# Altium footprint library Mechanical_Old.PcbLib: 125 footprints (part 4 of 8)
Each footprint in its own frame and in the unit in brackets; x right, y up, seen from the top. Pads: shape width x height; smd on the part's side, far side on the other; paste and mask are expansions set on the pad; w line width, h text height; cw(c..) or ccw(c..) is an arc to the next point about the centre after c.
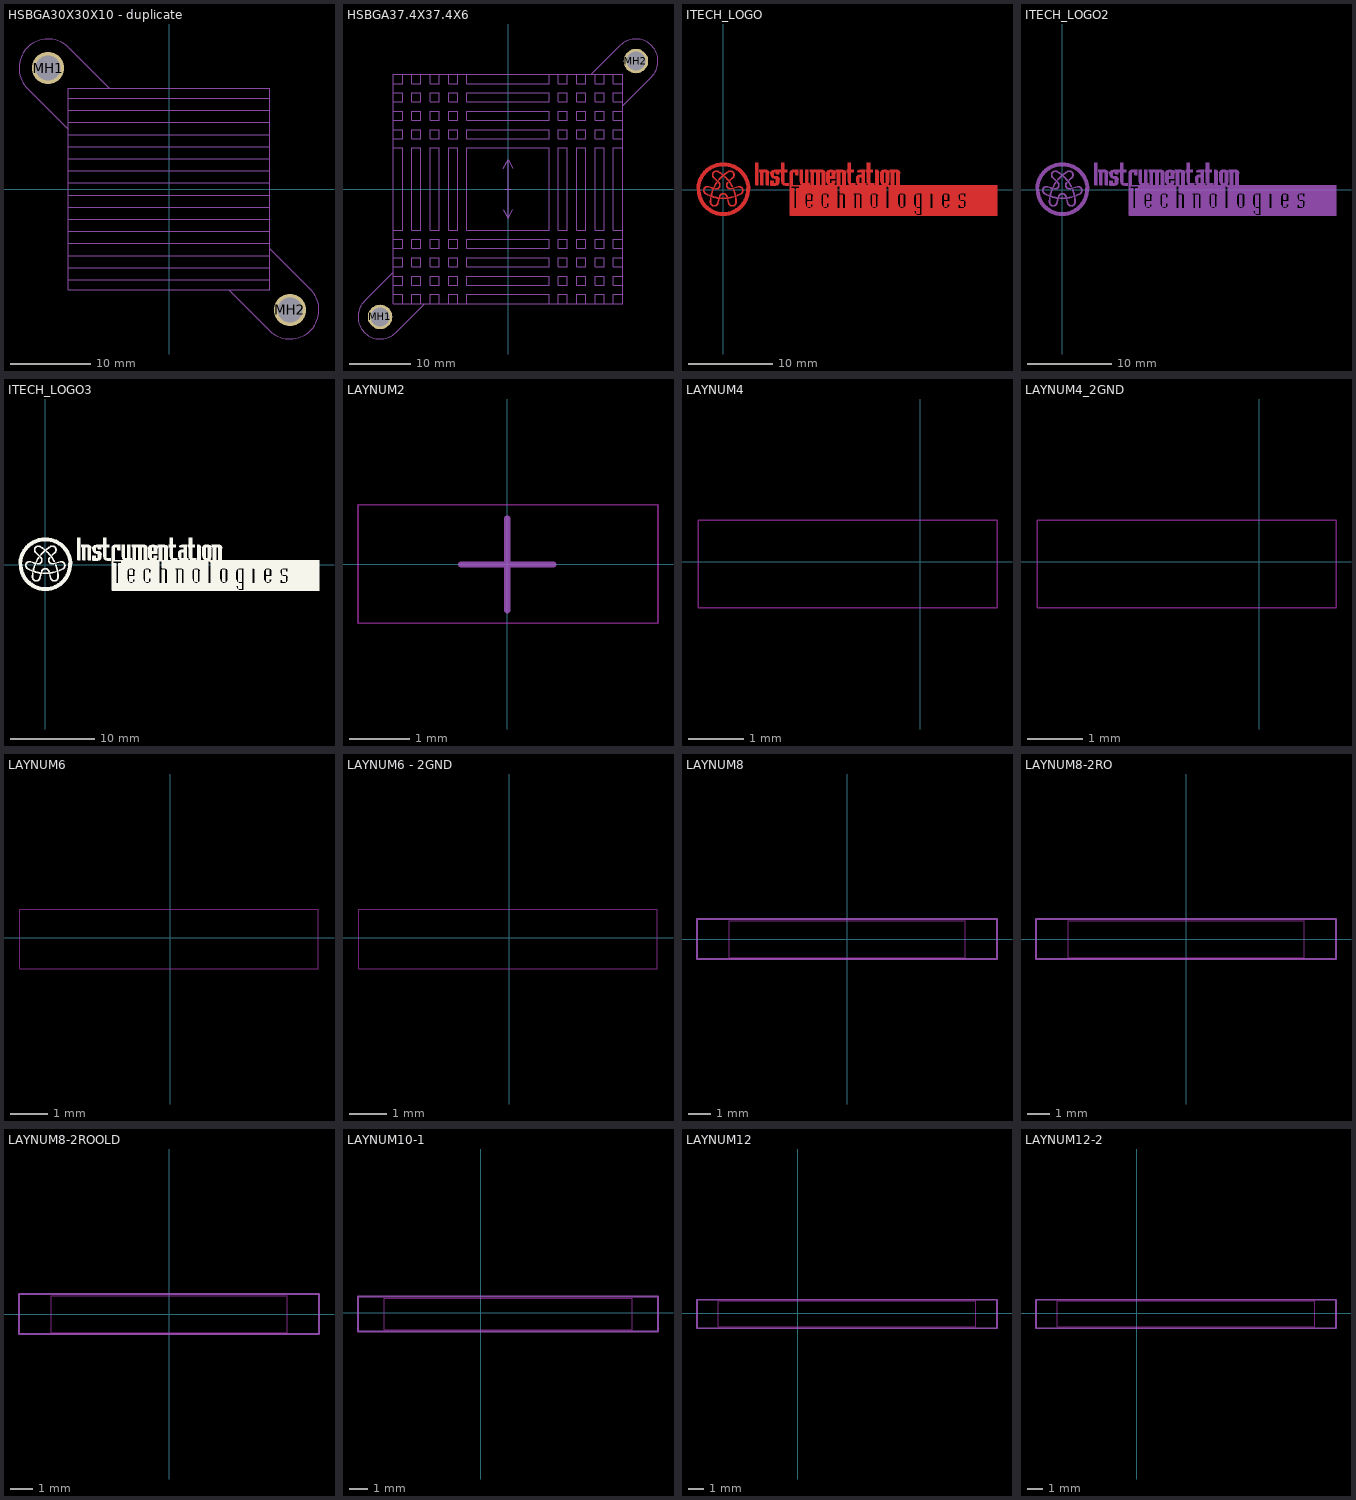
[diagram p3: the footprints below, top view; thin cyan lines are the x and y axes]

## HSBGA30X30X10 - duplicate [mm] "Heatsink BGA 30x30x10mm with push pins"
height 10
pads (2):
  round 4 hole 3.1 mask+0.254: MH1(-15,15) MH2(15,-15)
Mechanical 13:
  circle w0.104: c15,-15 r1.5
  circle w0.104: c-15,15 r1.5
  lines w0.102: -17.546,12.454 -12.496,7.404 ; -12.5,-11.25 12.5,-11.25 ; -12.5,-9.75 12.5,-9.75 ; -12.5,-8.25 12.5,-8.25 ; -12.5,-6.75 12.5,-6.75 ; -12.5,-5.25 12.5,-5.25 ; -12.5,-3.75 12.5,-3.75 ; -12.5,-2.25 12.5,-2.25 ; -12.5,-0.75 12.5,-0.75 ; -12.5,0.75 12.5,0.75 ; -12.5,2.25 12.5,2.25 ; -12.5,3.75 12.5,3.75 ; -12.5,5.25 12.5,5.25 ; -12.5,6.75 12.5,6.75 ; -12.5,8.25 12.5,8.25 ; -12.5,9.75 12.5,9.75 ; -12.5,11.25 12.5,11.25 ; -12.454,17.546 -7.454,12.546 ; 7.454,-12.546 12.454,-17.546 ; 12.496,-7.404 17.546,-12.454 ; -12.5,-12.5 12.5,-12.5 12.5,12.5 -12.5,12.5 -12.5,-12.5
  lines w0.104: -17.546,12.454 cw(c-15,15) -12.454,17.546 ; 12.454,-17.546 ccw(c15,-15) 17.546,-12.454
3D body: height 12.2, standoff 2.2, extent -12.5,-12.5 -1.6,-11.25
3D body: height 12.2, standoff 2.2, extent 1.6,-12.5 12.5,-11.25
3D body: height 12.2, standoff 2.2, extent -12.5,-9.5 -1.6,-8.25
3D body: height 12.2, standoff 2.2, extent 1.6,-9.5 12.5,-8.25
3D body: height 12.2, standoff 2.2, extent -12.5,-6.5 -1.6,-5.25
3D body: height 12.2, standoff 2.2, extent 1.6,-6.5 12.5,-5.25
3D body: height 12.2, standoff 2.2, extent -12.5,-3.5 -1.6,-2.25
3D body: height 12.2, standoff 2.2, extent 1.6,-3.5 12.5,-2.25
3D body: height 12.2, standoff 2.2, extent -12.5,-0.5 -1.6,0.75
3D body: height 12.2, standoff 2.2, extent 1.6,-0.5 12.5,0.75
3D body: height 12.2, standoff 2.2, extent -12.5,2.5 -1.6,3.75
3D body: height 12.2, standoff 2.2, extent 1.6,2.5 12.5,3.75
3D body: height 12.2, standoff 2.2, extent -12.5,5.5 -1.6,6.75
3D body: height 12.2, standoff 2.2, extent 1.6,5.5 12.5,6.75
3D body: height 12.2, standoff 2.2, extent -12.5,8.5 -1.6,9.75
3D body: height 12.2, standoff 2.2, extent 1.6,8.5 12.5,9.75
3D body: height 12.2, standoff 2.2, extent 1.6,11.25 12.5,12.5
3D body: height 12.2, standoff 2.2, extent -12.5,11.25 -1.6,12.5
3D body: height 3.2, standoff 2.2, extent 11.4,-18.593 18.571,-11.407
3D body: height 3.2, standoff 2.2, extent 7.4,-17.546 17.546,-7.404
3D body: height 3.2, standoff 2.2, extent -17.546,7.404 -7.4,17.546
3D body: height 3.2, standoff 2.2, extent -18.571,11.407 -11.4,18.593
3D body: height 3.2, standoff 2.2, extent -12.5,-12.5 12.5,12.5

## HSBGA37.4X37.4X6 [mm] "Heatsink BGA 37.4x37.4x6mm with push pins"
height 6
pads (2):
  round 4 hole 3.1 mask+0.254: MH1(-20.87,-20.87) MH2(20.87,20.87)
Mechanical 13:
  drawing of 337 lines, arcs and shapes, not listed
Mechanical 15:
  lines w0.102: -0.5,0 0.5,0 ; 0,-0.5 0,0.5
  text "Dvigni po potrebi!" at -12.7,19.6 h1.52
3D body: height 10.55, standoff 4.55, extent -18.7,-6.7 -17.2,6.7
3D body: height 10.55, standoff 4.55, extent -15.7,-6.7 -14.2,6.7
3D body: height 10.55, standoff 4.55, extent -12.7,-6.7 -11.2,6.7
3D body: height 10.55, standoff 4.55, extent -9.7,-6.7 -8.2,6.7
3D body: height 10.55, standoff 4.55, extent 8.2,-6.7 9.7,6.7
3D body: height 10.55, standoff 4.55, extent 11.2,-6.7 12.7,6.7
3D body: height 10.55, standoff 4.55, extent 14.2,-6.7 15.7,6.7
3D body: height 10.55, standoff 4.55, extent 17.2,-6.7 18.7,6.7
3D body: height 10.55, standoff 4.55, extent -6.7,17.2 6.7,18.7
3D body: height 10.55, standoff 4.55, extent -6.7,14.2 6.7,15.7
3D body: height 10.55, standoff 4.55, extent -6.7,11.2 6.7,12.7
3D body: height 10.55, standoff 4.55, extent -6.7,8.2 6.7,9.7
3D body: height 10.55, standoff 4.55, extent -6.7,-18.7 6.7,-17.2
3D body: height 10.55, standoff 4.55, extent -6.7,-15.7 6.7,-14.2
3D body: height 10.55, standoff 4.55, extent -6.7,-12.7 6.7,-11.2
3D body: height 10.55, standoff 4.55, extent -6.7,-9.7 6.7,-8.2
3D body: height 10.55, standoff 4.55, extent -6.7,-6.7 6.7,6.7
3D body: height 10.55, standoff 4.55, extent -18.7,17.2 -17.2,18.7
3D body: height 10.55, standoff 4.55, extent -15.7,17.2 -14.2,18.7
3D body: height 10.55, standoff 4.55, extent -15.7,14.2 -14.2,15.7
3D body: height 10.55, standoff 4.55, extent -18.7,14.2 -17.2,15.7
3D body: height 10.55, standoff 4.55, extent -12.7,17.2 -11.2,18.7
3D body: height 10.55, standoff 4.55, extent -12.7,14.2 -11.2,15.7
3D body: height 10.55, standoff 4.55, extent -9.7,17.2 -8.2,18.7
3D body: height 10.55, standoff 4.55, extent -9.7,14.2 -8.2,15.7
3D body: height 10.55, standoff 4.55, extent -9.7,11.2 -8.2,12.7
3D body: height 10.55, standoff 4.55, extent -12.7,11.2 -11.2,12.7
3D body: height 10.55, standoff 4.55, extent -15.7,11.2 -14.2,12.7
3D body: height 10.55, standoff 4.55, extent -18.7,11.2 -17.2,12.7
3D body: height 10.55, standoff 4.55, extent -18.7,8.2 -17.2,9.7
3D body: height 10.55, standoff 4.55, extent -15.7,8.2 -14.2,9.7
3D body: height 10.55, standoff 4.55, extent -12.7,8.2 -11.2,9.7
3D body: height 10.55, standoff 4.55, extent -9.7,8.2 -8.2,9.7
3D body: height 10.55, standoff 4.55, extent 8.2,17.2 9.7,18.7
3D body: height 10.55, standoff 4.55, extent 11.2,17.2 12.7,18.7
3D body: height 10.55, standoff 4.55, extent 14.2,17.2 15.7,18.7
3D body: height 10.55, standoff 4.55, extent 17.2,17.2 18.7,18.7
3D body: height 10.55, standoff 4.55, extent 17.2,14.2 18.7,15.7
3D body: height 10.55, standoff 4.55, extent 17.2,11.2 18.7,12.7
3D body: height 10.55, standoff 4.55, extent 17.2,8.2 18.7,9.7
3D body: height 10.55, standoff 4.55, extent 14.2,8.2 15.7,9.7
3D body: height 10.55, standoff 4.55, extent 14.2,11.2 15.7,12.7
3D body: height 10.55, standoff 4.55, extent 14.2,14.2 15.7,15.7
3D body: height 10.55, standoff 4.55, extent 11.2,14.2 12.7,15.7
3D body: height 10.55, standoff 4.55, extent 11.2,11.2 12.7,12.7
3D body: height 10.55, standoff 4.55, extent 11.2,8.2 12.7,9.7
3D body: height 10.55, standoff 4.55, extent 8.2,8.2 9.7,9.7
3D body: height 10.55, standoff 4.55, extent 8.2,11.2 9.7,12.7
3D body: height 10.55, standoff 4.55, extent 8.2,14.2 9.7,15.7
3D body: height 10.55, standoff 4.55, extent 8.2,-9.7 9.7,-8.2
3D body: height 10.55, standoff 4.55, extent 11.2,-9.7 12.7,-8.2
3D body: height 10.55, standoff 4.55, extent 14.2,-9.7 15.7,-8.2
3D body: height 10.55, standoff 4.55, extent 17.2,-9.7 18.7,-8.2
3D body: height 10.55, standoff 4.55, extent 17.2,-12.7 18.7,-11.2
3D body: height 10.55, standoff 4.55, extent 17.2,-15.7 18.7,-14.2
3D body: height 10.55, standoff 4.55, extent 17.2,-18.7 18.7,-17.2
3D body: height 10.55, standoff 4.55, extent 14.2,-18.7 15.7,-17.2
3D body: height 10.55, standoff 4.55, extent 11.2,-18.7 12.7,-17.2
3D body: height 10.55, standoff 4.55, extent 8.2,-18.7 9.7,-17.2
3D body: height 10.55, standoff 4.55, extent 8.2,-15.7 9.7,-14.2
3D body: height 10.55, standoff 4.55, extent 11.2,-15.7 12.7,-14.2
3D body: height 10.55, standoff 4.55, extent 14.2,-15.7 15.7,-14.2
3D body: height 10.55, standoff 4.55, extent 14.2,-12.7 15.7,-11.2
3D body: height 10.55, standoff 4.55, extent 11.2,-12.7 12.7,-11.2
3D body: height 10.55, standoff 4.55, extent 8.2,-12.7 9.7,-11.2
3D body: height 10.55, standoff 4.55, extent -18.7,-9.7 -17.2,-8.2
3D body: height 10.55, standoff 4.55, extent -15.7,-9.7 -14.2,-8.2
3D body: height 10.55, standoff 4.55, extent -12.7,-9.7 -11.2,-8.2
3D body: height 10.55, standoff 4.55, extent -9.7,-9.7 -8.2,-8.2
3D body: height 10.55, standoff 4.55, extent -9.7,-12.7 -8.2,-11.2
3D body: height 10.55, standoff 4.55, extent -12.7,-12.7 -11.2,-11.2
3D body: height 10.55, standoff 4.55, extent -15.7,-12.7 -14.2,-11.2
3D body: height 10.55, standoff 4.55, extent -18.7,-12.7 -17.2,-11.2
3D body: height 10.55, standoff 4.55, extent -18.7,-15.7 -17.2,-14.2
3D body: height 10.55, standoff 4.55, extent -15.7,-15.7 -14.2,-14.2
3D body: height 10.55, standoff 4.55, extent -12.7,-15.7 -11.2,-14.2
3D body: height 10.55, standoff 4.55, extent -9.7,-15.7 -8.2,-14.2
3D body: height 10.55, standoff 4.55, extent -9.7,-18.7 -8.2,-17.2
3D body: height 10.55, standoff 4.55, extent -12.7,-18.7 -11.2,-17.2
3D body: height 10.55, standoff 4.55, extent -15.7,-18.7 -14.2,-17.2
3D body: height 10.55, standoff 4.55, extent -18.7,-18.7 -17.2,-17.2
3D body: height 5.85, standoff 4.55, extent -18.7,-18.7 18.7,18.7
3D body: height 5.85, standoff 4.55, extent -24.511,-24.511 -13.6,-13.6
3D body: height 5.85, standoff 4.55, extent 13.6,13.6 24.511,24.511
3D body: height 10.55, standoff 0, extent -22.42,-22.42 -19.332,-19.326
3D body: height 10.55, standoff 0, extent 19.332,19.326 22.42,22.42
3D body: height 11.55, standoff 10.55, extent -22.85,-22.875 -18.866,-18.883
3D body: height 11.55, standoff 10.55, extent 18.866,18.883 22.85,22.875

## ITECH_LOGO [mm] "logotip in copper"
Top Layer:
  drawing of 3429 lines, arcs and shapes, not listed

## ITECH_LOGO2 [mm] "logotip in Solder Mask"
Top Solder:
  drawing of 3429 lines, arcs and shapes, not listed

## ITECH_LOGO3 [mm] "logotip in Silk Screen"
Top Overlay:
  drawing of 3429 lines, arcs and shapes, not listed

## LAYNUM2 [mm]
Top Layer:
  text "Top" at -0.906,-0.359 h1.14
Bottom Layer:
  text "Bot" at 2.15,-0.375 h1.14
Top Solder:
  text "T" at -2.2,-0.375 h1.14
Bottom Solder:
  text "B" at -1.2,-0.375 h1.14
Keep-Out Layer:
  lines w0.025: -2.475,-0.975 -2.475,0.987 2.5,0.987 2.5,-0.975 -2.475,-0.975
Mechanical 15:
  lines w0.102: -0.762,0 0.762,0 ; 0,-0.762 0,0.762

## LAYNUM4 [mm]
Top Layer:
  text "1" at -3.531,-0.584 h1.14
MidLayer1:
  text "3" at -0.991,-0.584 h1.14
  text "3" at -0.991,-0.584 h1.14
Bottom Layer:
  text "4" at 0.3,-0.6 h1.14
Top Solder:
  rectangle: -4.064,-0.864 1.4,0.787
  text "T" at -5.3,-0.6 h1.14
Bottom Solder:
  rectangle: -4.064,-0.864 1.4,0.787
  text "B" at 2.6,-0.6 h1.14
InternalPlane1:
  rectangle: -1.219,-0.838 1.4,0.762
  rectangle: -4.039,-0.838 -2.642,0.762
  text "2" at -2.261,-0.584 h1.14
Keep-Out Layer:
  lines w0.025: -4.039,-0.838 1.4,-0.838 1.4,0.762 -4.039,0.762 -4.039,-0.838

## LAYNUM4_2GND [mm] "TOP GND GND BOT"
Top Layer:
  text "1" at -3.531,-0.584 h1.14
Bottom Layer:
  text "4" at 0.3,-0.6 h1.14
Top Solder:
  rectangle: -4.064,-0.864 1.4,0.787
  text "T" at -5.3,-0.6 h1.14
Bottom Solder:
  rectangle: -4.064,-0.864 1.4,0.787
  text "B" at 2.6,-0.6 h1.14
InternalPlane1:
  rectangle: -1.219,-0.838 1.4,0.762
  rectangle: -4.039,-0.838 -2.642,0.762
  text "2" at -2.261,-0.584 h1.14
InternalPlane2:
  region: 1.372,0.762 -0.025,0.762 -0.025,-0.838 1.372,-0.838
  region: -1.419,0.762 -4.039,0.762 -4.039,-0.838 -1.419,-0.838
  text "3" at -1.092,-0.61 h1.14
Keep-Out Layer:
  lines w0.025: -4.039,-0.838 1.4,-0.838 1.4,0.762 -4.039,0.762 -4.039,-0.838

## LAYNUM6 [mm]
Top Layer:
  text "1" at -3.531,-0.584 h1.14
MidLayer1:
  text "3" at -0.991,-0.584 h1.14
  text "3" at -0.991,-0.584 h1.14
MidLayer2:
  text "5" at 1.549,-0.584 h1.14
Bottom Layer:
  text "6" at 2.819,-0.584 h1.14
Top Solder:
  rectangle: -4.064,-0.864 3.988,0.787
  text "T" at -5.3,-0.6 h1.14
Bottom Solder:
  rectangle: -4.064,-0.864 3.988,0.787
  text "B" at 5.3,-0.6 h1.14
InternalPlane1:
  rectangle: -4.039,-0.838 -2.642,0.762
  rectangle: -1.219,-0.838 3.962,0.762
  text "2" at -2.261,-0.584 h1.14
InternalPlane2:
  rectangle: -4.039,-0.838 0,0.762
  rectangle: 1.27,-0.838 3.962,0.762
  text "4" at 0.279,-0.584 h1.14
  text "4" at 0.279,-0.584 h1.14
Keep-Out Layer:
  lines w0.025: -4.039,-0.838 -4.039,0.762 3.937,0.762 3.962,0.762 3.962,-0.838 -4.039,-0.838

## LAYNUM6 - 2GND [mm]
Top Layer:
  text "1" at -3.429,-0.61 h1.14
MidLayer1:
  text "3" at -1.143,-0.61 h1.14
MidLayer2:
  text "4" at 0.254,-0.61 h1.14
Bottom Layer:
  text "6" at 2.819,-0.61 h1.14
Top Solder:
  rectangle: -4.064,-0.864 3.988,0.787
  text "T" at -5.3,-0.6 h1.14
Bottom Solder:
  rectangle: -4.064,-0.864 3.988,0.787
  text "B" at 5.3,-0.6 h1.14
InternalPlane1:
  rectangle: -1.575,-0.813 3.937,0.737
  rectangle: -4.013,-0.813 -2.743,0.737
  text "2" at -2.54,-0.584 h1.14
InternalPlane2:
  rectangle: 2.489,-0.813 3.937,0.737
  rectangle: -4.013,-0.813 1.321,0.737
  text "5" at 1.524,-0.635 h1.14
Keep-Out Layer:
  lines w0.025: -4.039,-0.838 3.962,-0.838 3.962,0.762 3.937,0.762 -4.039,0.762 -4.039,-0.838

## LAYNUM8 [mm] "PCB 1.6mm 8layer 2GND no POW"
Top Layer:
  text "1" at -4.826,-0.584 h1.78
MidLayer1:
  text "3" at -2.21,-0.584 h1.78
MidLayer2:
  text "4" at -0.965,-0.584 h1.78
MidLayer3:
  text "5" at 0.33,-0.584 h1.78
MidLayer4:
  text "6" at 1.676,-0.584 h1.78
Bottom Layer:
  text "8" at 4.166,-0.584 h1.78
Top Solder:
  text "T" at -6.477,-0.584 h1.78
Bottom Solder:
  text "B" at 6.401,-0.584 h1.78
InternalPlane1:
  rectangle: -2.489,-0.838 5.232,0.813
  rectangle: -5.258,-0.838 -3.81,0.813
  text "2" at -3.556,-0.584 h1.78
InternalPlane2:
  region: 2.642,0.813 -5.258,0.813 -5.258,-0.838 2.642,-0.838
  region: 5.243,0.813 3.912,0.813 3.912,-0.838 5.243,-0.838
  text "7" at 2.896,-0.584 h1.78
Keep-Out Layer:
  lines w0.025: -5.258,-0.838 5.243,-0.838 5.243,0.813 -5.258,0.813 -5.258,-0.838
Mechanical 15:
  lines w0.102: -6.68,-0.889 6.655,-0.889 6.655,0.889 -6.68,0.889 -6.68,-0.889

## LAYNUM8-2RO [mm] "PCB 1.5mm 8layer 4GND 1 POW 2Ro4350"
Top Layer:
  text "1" at -4.826,-0.584 h1.78
MidLayer1:
  text "3" at -2.21,-0.584 h1.78
MidLayer2:
  text "6" at 1.676,-0.584 h1.78
Bottom Layer:
  text "8" at 4.166,-0.584 h1.78
Top Solder:
  text "T" at -6.477,-0.584 h1.78
Bottom Solder:
  text "B" at 6.401,-0.584 h1.78
InternalPlane1:
  rectangle: -2.489,-0.838 5.232,0.813
  rectangle: -5.258,-0.838 -3.81,0.813
  text "2" at -3.556,-0.584 h1.78
InternalPlane2:
  rectangle: 0,-0.838 5.232,0.813
  region: -1.219,0.838 -5.232,0.838 -5.232,-0.813 -1.219,-0.813
  text "4" at -0.965,-0.584 h1.78
InternalPlane3:
  region: 5.258,0.838 1.473,0.838 1.473,-0.813 5.258,-0.813
  rectangle: -5.258,-0.838 0,0.813
  text "5" at 0.33,-0.584 h1.78
InternalPlane4:
  region: 5.258,0.838 3.962,0.838 3.962,-0.813 5.258,-0.813
  rectangle: -5.258,-0.838 2.616,0.813
  text "7" at 2.896,-0.584 h1.78
Keep-Out Layer:
  lines w0.025: -5.258,-0.838 5.243,-0.838 5.243,0.813 -5.258,0.813 -5.258,-0.838
Mechanical 15:
  lines w0.102: -6.68,-0.889 6.655,-0.889 6.655,0.889 -6.68,0.889 -6.68,-0.889

## LAYNUM8-2ROOLD [mm] "PCB 1.5mm 8layer 4GND 1 POW 2Ro4350"
Top Layer:
  text "1" at -4.826,-0.584 h1.78
MidLayer1:
  text "3" at -2.21,-0.584 h1.78
MidLayer2:
  text "4" at -0.965,-0.584 h1.78
MidLayer3:
  text "6" at 1.676,-0.584 h1.78
Bottom Layer:
  text "8" at 4.166,-0.584 h1.78
Top Solder:
  text "T" at -6.477,-0.584 h1.78
Bottom Solder:
  text "B" at 6.401,-0.584 h1.78
InternalPlane1:
  rectangle: -2.489,-0.838 5.232,0.813
  rectangle: -5.258,-0.838 -3.81,0.813
  text "2" at -3.556,-0.584 h1.78
InternalPlane2:
  rectangle: 1.397,-0.838 5.232,0.813
  rectangle: -5.258,-0.838 0,0.813
  text "5" at 0.33,-0.584 h1.78
InternalPlane3:
  region: 2.54,0.838 -5.232,0.838 -5.232,-0.813 2.54,-0.813
  region: 5.258,0.838 3.937,0.838 3.937,-0.813 5.258,-0.813
  text "7" at 2.896,-0.584 h1.78
Keep-Out Layer:
  lines w0.025: -5.258,-0.838 5.243,-0.838 5.243,0.813 -5.258,0.813 -5.258,-0.838
Mechanical 15:
  lines w0.102: -6.68,-0.889 6.655,-0.889 6.655,0.889 -6.68,0.889 -6.68,-0.889

## LAYNUM10-1 [mm] "PCB 1.6mm 10 layer SGSSPPSSGS"
Top Layer:
  text "1" at -4.826,-0.584 h1.78
MidLayer1:
  text "3" at -2.21,-0.584 h1.78
MidLayer2:
  text "4" at -0.965,-0.584 h1.78
MidLayer3:
  text "7" at 2.896,-0.584 h1.78
MidLayer4:
  text "8" at 4.166,-0.584 h1.78
Bottom Layer:
  text "10" at 6.5,-0.6 h1.78
Top Solder:
  text "T" at -6.477,-0.584 h1.78
Bottom Solder:
  text "B" at 9.445,-0.584 h1.78
InternalPlane1:
  rectangle: -2.4,-0.889 8.255,0.8
  rectangle: -5.2,-0.889 -3.752,0.8
  text "2" at -3.556,-0.584 h1.78
InternalPlane2:
  region: 0.058,0.8 -5.2,0.8 -5.2,-0.9 0.058,-0.9
  region: 8.255,0.8 1.3,0.8 1.3,-0.9 8.255,-0.9
  text "5" at 0.33,-0.584 h1.78
InternalPlane3:
  region: 8.255,0.8 2.7,0.8 2.7,-0.9 8.255,-0.9
  region: 1.4,0.8 -5.2,0.8 -5.2,-0.9 1.4,-0.9
  text "6" at 1.676,-0.584 h1.78
InternalPlane4:
  region: 8.255,0.8 6.477,0.8 6.477,-0.9 8.255,-0.9
  region: 5.207,0.8 -5.2,0.8 -5.2,-0.9 5.207,-0.9
  text "9" at 5.466,-0.584 h1.78
Keep-Out Layer:
  lines w0.025: -5.258,-0.9 8.255,-0.9 8.255,0.813 -5.258,0.813 -5.258,-0.9
Mechanical 15:
  lines w0.102: -6.68,-1 9.652,-1 9.652,0.889 -6.68,0.889 -6.68,-1

## LAYNUM12 [mm] "PCB 1.6mm 12 layer SGSSGPPGSSGS"
Top Layer:
  text "1" at -4.826,-0.584 h1.78
MidLayer1:
  text "3" at -2.21,-0.584 h1.78
MidLayer2:
  text "4" at -0.965,-0.584 h1.78
MidLayer3:
  text "9" at 5.466,-0.584 h1.78
MidLayer4:
  text "10" at 6.5,-0.6 h1.78
Bottom Layer:
  text "12" at 10,-0.6 h1.78
Top Solder:
  text "T" at -6.477,-0.584 h1.78
Bottom Solder:
  text "B" at 13.001,-0.584 h1.78
InternalPlane1:
  rectangle: -5.2,-0.889 -3.752,0.8
  rectangle: -2.4,-0.889 11.8,0.8
  text "2" at -3.556,-0.584 h1.78
InternalPlane2:
  region: 11.8,0.8 1.3,0.8 1.3,-0.9 11.8,-0.9
  region: 0.058,0.8 -5.2,0.8 -5.2,-0.9 0.058,-0.9
  text "5" at 0.33,-0.584 h1.78
InternalPlane3:
  region: 1.4,0.8 -5.2,0.8 -5.2,-0.9 1.4,-0.9
  region: 11.8,0.8 2.7,0.8 2.7,-0.9 11.8,-0.9
  text "6" at 1.676,-0.584 h1.78
InternalPlane4:
  region: 2.6,0.8 -5.2,0.8 -5.2,-0.9 2.6,-0.9
  region: 11.8,0.8 3.9,0.8 3.9,-0.9 11.8,-0.9
  text "7" at 2.896,-0.584 h1.78
InternalPlane5:
  region: 11.8,0.8 5.2,0.8 5.2,-0.9 11.8,-0.9
  region: 3.9,0.8 -5.2,0.8 -5.2,-0.9 3.9,-0.9
  text "8" at 4.166,-0.584 h1.78
InternalPlane6:
  region: 8.2,0.8 -5.2,0.8 -5.2,-0.9 8.2,-0.9
  region: 11.8,0.8 9.8,0.8 9.8,-0.9 11.8,-0.9
  text "11" at 8.3,-0.6 h1.78
Keep-Out Layer:
  lines w0.025: -5.258,-0.9 -5.258,0.813 11.843,0.813 11.843,-0.9 -5.258,-0.9
Mechanical 15:
  lines w0.102: -6.68,-1 -6.68,0.889 13.255,0.889 13.255,-1 -6.68,-1

## LAYNUM12-2 [mm] "PCB 1.6mm 12 layer SGSGSPPSGSGS"
Top Layer:
  text "1" at -4.826,-0.584 h1.78
MidLayer1:
  text "3" at -2.21,-0.584 h1.78
MidLayer2:
  text "5" at 0.33,-0.584 h1.78
MidLayer3:
  text "8" at 4.166,-0.584 h1.78
MidLayer4:
  text "10" at 6.5,-0.6 h1.78
Bottom Layer:
  text "12" at 10,-0.6 h1.78
Top Solder:
  text "T" at -6.477,-0.584 h1.78
Bottom Solder:
  text "B" at 13.001,-0.584 h1.78
InternalPlane1:
  rectangle: -2.4,-0.889 11.8,0.8
  rectangle: -5.2,-0.889 -3.752,0.8
  text "2" at -3.556,-0.584 h1.78
InternalPlane2:
  region: -1.2,0.8 -5.2,0.8 -5.2,-0.9 -1.2,-0.9
  region: 11.8,0.8 0,0.8 0,-0.9 11.8,-0.9
  text "4" at -0.965,-0.584 h1.78
InternalPlane3:
  region: 11.8,0.8 2.7,0.8 2.7,-0.9 11.8,-0.9
  region: 1.4,0.8 -5.2,0.8 -5.2,-0.9 1.4,-0.9
  text "6" at 1.676,-0.584 h1.78
InternalPlane4:
  region: 11.8,0.8 3.9,0.8 3.9,-0.9 11.8,-0.9
  region: 2.6,0.8 -5.2,0.8 -5.2,-0.9 2.6,-0.9
  text "7" at 2.896,-0.584 h1.78
InternalPlane5:
  region: 5.2,0.8 -5.2,0.8 -5.2,-0.9 5.2,-0.9
  region: 11.8,0.8 6.5,0.8 6.5,-0.9 11.8,-0.9
  text "9" at 5.466,-0.584 h1.78
InternalPlane6:
  region: 11.8,0.8 9.8,0.8 9.8,-0.9 11.8,-0.9
  region: 8.2,0.8 -5.2,0.8 -5.2,-0.9 8.2,-0.9
  text "11" at 8.3,-0.6 h1.78
Keep-Out Layer:
  lines w0.025: -5.258,-0.9 11.843,-0.9 11.843,0.813 -5.258,0.813 -5.258,-0.9
Mechanical 15:
  lines w0.102: -6.68,-1 13.255,-1 13.255,0.889 -6.68,0.889 -6.68,-1